# Altium footprint library SG__PCB_HOLE_Connector.PcbLib: 154 footprints (part 1 of 10)
Each footprint in its own frame and in the unit in brackets; x right, y up, seen from the top. Pads: shape width x height; smd on the part's side, far side on the other; paste and mask are expansions set on the pad; w line width, h text height; cw(c..) or ccw(c..) is an arc to the next point about the centre after c.
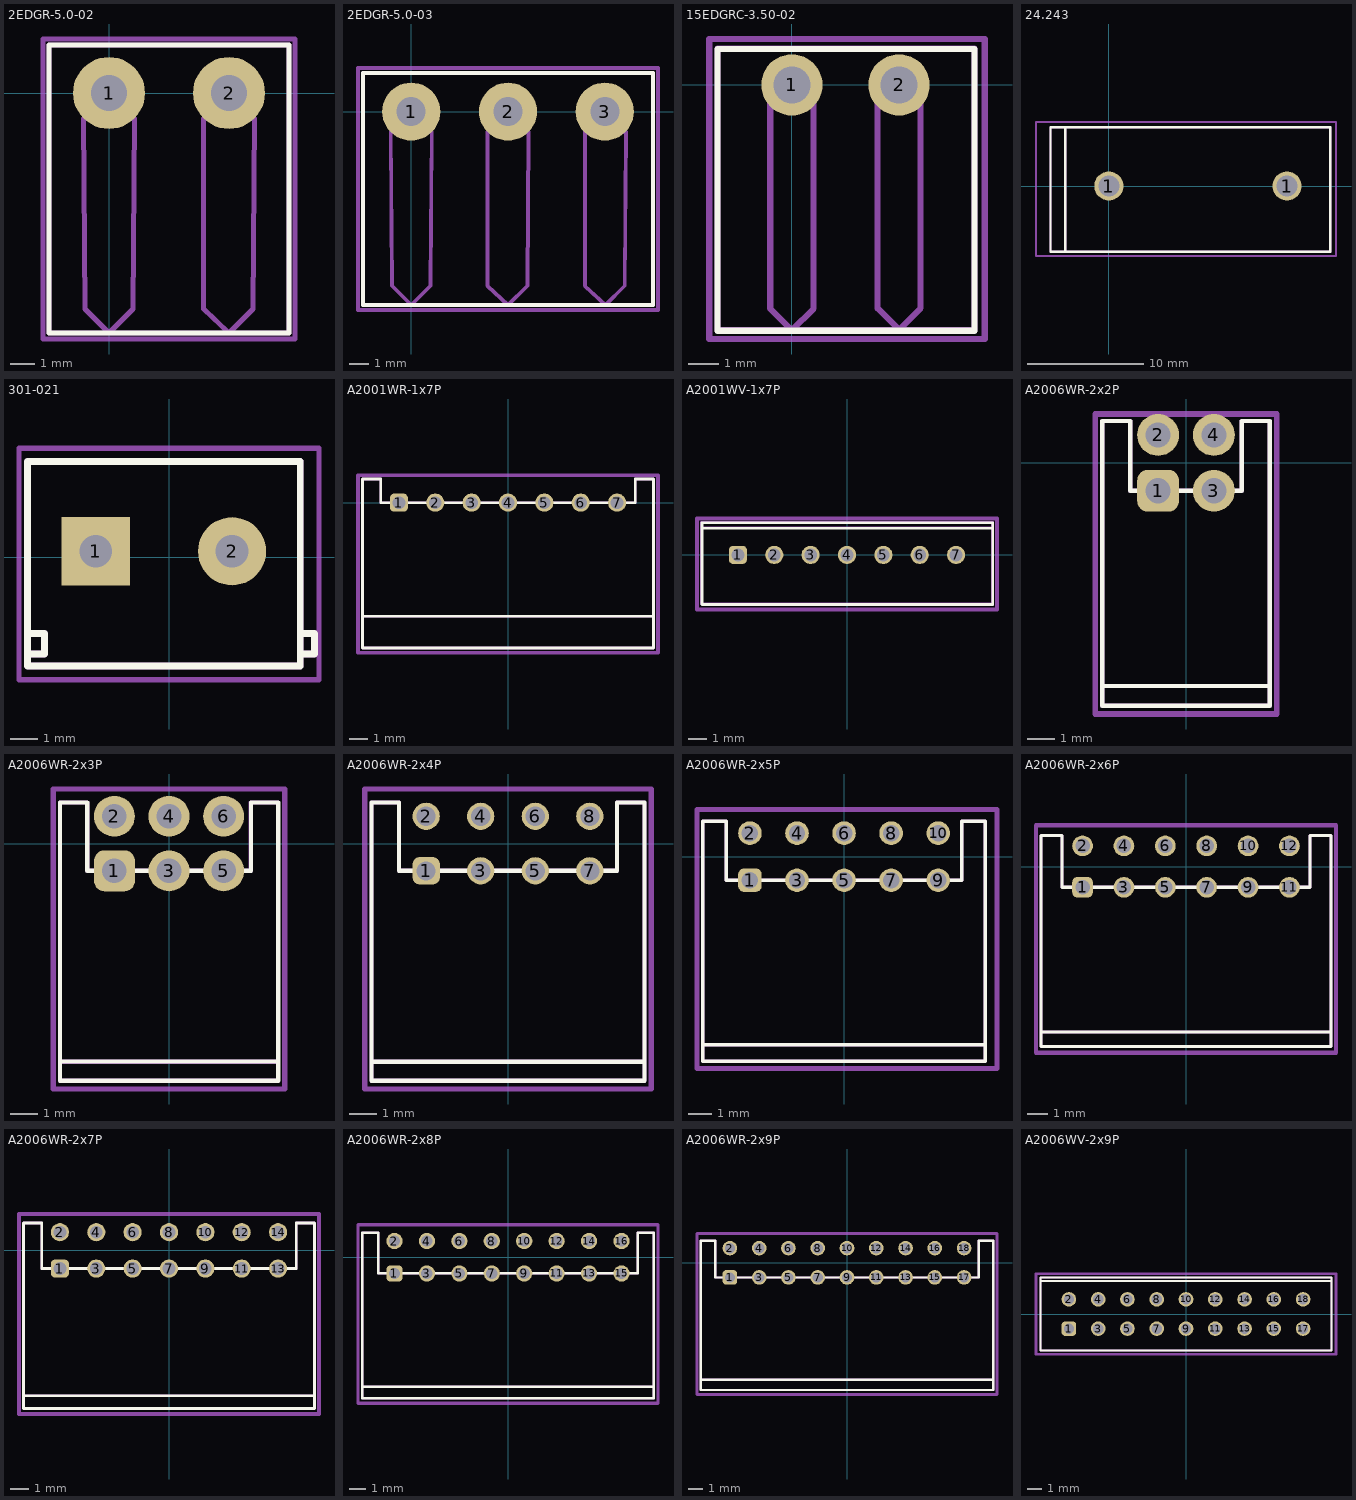
[diagram p0: the footprints below, top view; thin cyan lines are the x and y axes]

## 2EDGR-5.0-02 [mm]
pads (2):
  round 3 hole 1.5: 1(0,0) 2(5,0)
Top Overlay:
  lines w0.2: -2.5,-10 7.5,-10 7.5,2 -2.5,2 -2.5,-10
Top Assembly:
  lines w0.2: 1,-1.061 -1.061,-1.061 -1,-9 0,-10 1,-9 1.061,-1.061 ; 5.801,-1.061 6,-1.061 3.939,-1.061 3.939,-9 5,-10 6,-9 6.061,-1.061 ; -2.5,-10 -2.5,2 7.5,2 7.5,-10 -2.5,-10
Top Courtyard:
  lines w0.2: -2.75,-10.25 7.75,-10.25 7.75,2.25 -2.75,2.25 -2.75,-10.25
3D body "2EDGR-5.0-02P-1Y-100AH.stp": height 8.9, standoff -2.8, extent -2.5,-10 7.5,2

## 2EDGR-5.0-03 [mm]
pads (3):
  round 3 hole 1.5: 1(0,0) 2(5,0) 3(10,0)
Top Overlay:
  lines w0.2: -2.5,-10 -2.5,2 12.5,2 12.5,-10 -2.5,-10
Top Assembly:
  lines w0.2: 1,-1.061 -1.061,-1.061 -1,-9 0,-10 1,-9 1.061,-1.061 ; 5.801,-1.061 6,-1.061 3.939,-1.061 3.939,-9 5,-10 6,-9 6.061,-1.061 ; 10.831,-1.061 11.03,-1.061 8.97,-1.061 8.97,-9 10.03,-10 11.03,-9 11.091,-1.061 ; -2.5,-10 12.5,-10 12.5,2 -2.5,2 -2.5,-10
Top Courtyard:
  lines w0.2: -2.75,-10.25 -2.75,2.25 12.75,2.25 12.75,-10.25 -2.75,-10.25
3D body "2EDGR-5.0-03P-1Y-100AH.stp": height 8.9, standoff -2.8, extent -2.5,-10 12.5,2

## 15EDGRC-3.50-02 [mm]
pads (2):
  round 2 hole 1.2: 1(0,0) 2(3.5,0)
Top Overlay:
  lines w0.2: -2.429,-8.031 -2.429,1.169 5.971,1.169 5.971,-8.031 -2.429,-8.031
Top Assembly:
  lines w0.2: -2.436,-8.015 5.963,-8.015 5.963,1.185 -2.436,1.185 -2.436,-8.015 ; -0.707,-7.307 -0.707,-0.5 0.707,-0.5 0.707,-7.307 0,-8.015 -0.707,-7.307 ; 2.8,-7.3 2.8,-0.5 4.207,-0.5 4.207,-7.293 3.5,-8 2.8,-7.3
Top Courtyard:
  lines w0.2: -2.7,-8.3 6.3,-8.3 6.3,1.5 -2.7,1.5 -2.7,-8.3
3D body "15EDGRC-THR-3.5-02P-13-10A(H).stp": height 7, standoff -3.6, extent -2.436,-8.015 5.963,1.185

## 24.243 [mm] "Banan_Deltron_571-0100"
pads (2):
  round 2.5 hole 1.8: 1(0,0) 1(15.3,0)
Top Overlay:
  lines w0.2: -3.837,5.05 -3.752,5.05 -3.752,-5.65 ; -5,-5.65 -5,5.05 19,5.05 19,-5.65 -5,-5.65
Top Assembly:
  lines w0.2: -3.837,5.05 -3.752,5.05 -3.752,-5.65 ; -5,-5.65 19,-5.65 19,5.05 -5,5.05 -5,-5.65
Top Courtyard:
  lines w0.2: -6.25,-6 -6.25,5.5 19.5,5.5 19.5,-6 -6.25,-6
3D body "Banana_black.step": height 13.5, standoff -5.5, extent -5,-5.65 19,5.05

## 301-021 [mm] "301-021 Клеммник"
pads (2):
  rect 2.5x2.5 hole 1.2: 1(-2.688,0.216)
  round 2.5 hole 1.2: 2(2.312,0.216)
Top Overlay:
  lines w0.254: -5.08,-3.556 -4.572,-3.556 -4.572,-2.794 -5.08,-2.794 ; 4.826,-3.556 5.334,-3.556 5.334,-2.794 4.826,-2.794 ; -5.188,-3.984 -5.188,3.516 4.812,3.516 4.812,-3.984 -5.188,-3.984
Top Assembly:
  lines w0.254: -5.08,-3.556 -4.572,-3.556 -4.572,-2.794 -5.08,-2.794 ; 4.826,-3.556 5.334,-3.556 5.334,-2.794 4.826,-2.794 ; -5.188,-3.984 4.812,-3.984 4.812,3.516 -5.188,3.516 -5.188,-3.984
Top Courtyard:
  lines w0.2: -5.5,-4.5 5.5,-4.5 5.5,4 -5.5,4 -5.5,-4.5
3D body "301-021.stp": height 10, standoff -3.46, extent -5.088,-3.884 5.412,3.716

## A2001WR-1x7P [mm] "PLD-7-2.0"
pads (7):
  rrect50% 1x1 / inner rrect50% 1.5x1.5 / far side rrect50% 1.6x1.6 hole 0.7: 1(-6,0)
  round 1 / inner round 1.5 / far side round 1.6 hole 0.7: 2(-4,0) 3(-2,0) 4(0,0) 5(2,0) 6(4,0) 7(6,0)
Top Overlay:
  lines w0.152: -8,-6.25 8,-6.25 ; -8,-8 -5.1,-8 8,-8 8,1.3 7,1.3 7,0 -1,0 -7,0 -7,1.3 -8,1.3 -8,0 -8,-8
Top Assembly:
  lines w0.152: -8,-6.25 8,-6.25 ; -8,-8 -8,0 -8,1.3 -7,1.3 -7,0 -1,0 7,0 7,1.3 8,1.3 8,-8 -5.1,-8 -8,-8
Top Courtyard:
  lines w0.2: -8.25,-8.25 8.25,-8.25 8.25,1.5 -8.25,1.5 -8.25,-8.25
3D body: height 4.85, standoff 0, extent -8,-8 8,1.3

## A2001WV-1x7P [mm] "PLD-7-2.0"
pads (7):
  rrect50% 1x1 / inner rrect50% 1.5x1.5 / far side rrect50% 1.6x1.6 hole 0.7: 1(-6,0)
  round 1 / inner round 1.5 / far side round 1.6 hole 0.7: 2(-4,0) 3(-2,0) 4(0,0) 5(2,0) 6(4,0) 7(6,0)
Top Overlay:
  lines w0.152: -7.982,1.468 8.018,1.468 ; -7.982,-2.732 -7.982,1.768 8.018,1.768 8.018,-2.732 -7.982,-2.732
Top Assembly:
  lines w0.152: -8,1.5 8,1.5 ; -8,-2.7 8,-2.7 8,1.8 -8,1.8 -8,-2.7
Top Courtyard:
  lines w0.2: -8.25,-3 -8.25,2 8.25,2 8.25,-3 -8.25,-3
3D body: height 6.1, standoff 0, extent -8,-2.7 8,1.8

## A2006WR-2x2P [mm] "PLD-10-2.0"
pads (4):
  rrect50% 1.5x1.5 hole 0.9: 1(-1,-1)
  round 1.5 hole 0.9: 2(-1,1) 3(1,-1) 4(1,1)
Top Overlay:
  lines w0.152: -3,-8 3,-8 ; -3,-8.7 3,-8.7 3,-3 3,1.5 2,1.5 2,-1 -2,-1 -2,1.5 -3,1.5 -3,-1 -3,-8.7
Top Assembly:
  lines w0.152: -3,-8 3,-8 ; -3,-8.7 3,-8.7 3,-3 3,1.5 2,1.5 2,-1 -2,-1 -2,1.5 -3,1.5 -3,-1 -3,-8.7
Top Courtyard:
  lines w0.2: -3.25,-9 -3.25,1.75 3.25,1.75 3.25,-9 -3.25,-9
3D body: height 5, standoff 0, extent -3,-8.7 3,1.5

## A2006WR-2x3P [mm] "PLD-10-2.0"
pads (6):
  rrect50% 1.5x1.5 hole 0.9: 1(-2,-1)
  round 1.5 hole 0.9: 2(-2,1) 3(0,-1) 4(0,1) 5(2,-1) 6(2,1)
Top Overlay:
  lines w0.152: -3.996,-7.996 4.004,-7.996 ; -3.996,-8.696 4.004,-8.696 4.004,-0.996 4.004,1.504 3.004,1.504 3.004,-0.996 -2.996,-0.996 -2.996,1.504 -3.996,1.504 -3.996,-0.996 -3.996,-8.696
Top Assembly:
  lines w0.152: -4,-8 4,-8 ; -4,-8.7 -4,-1 -4,1.5 -3,1.5 -3,-1 3,-1 3,1.5 4,1.5 4,-1 4,-8.7 -4,-8.7
Top Courtyard:
  lines w0.2: -4.25,-9 -4.25,2 4.25,2 4.25,-9 -4.25,-9
3D body: height 5, standoff 0, extent -4,-8.7 4,1.5

## A2006WR-2x4P [mm] "PLD-10-2.0"
pads (8):
  rrect50% 1x1 / inner rrect50% 1.5x1.5 / far side rrect50% 1.6x1.6 hole 0.7: 1(-3,-1)
  round 1 / inner round 1.5 / far side round 1.6 hole 0.7: 2(-3,1) 3(-1,-1) 4(-1,1) 5(1,-1) 6(1,1) 7(3,-1) 8(3,1)
Top Overlay:
  lines w0.152: -5,-8 5,-8 ; -5,-8.7 5,-8.7 5,-3 5,1.5 4,1.5 4,-1 2,-1 -4,-1 -4,1.5 -5,1.5 -5,-1 -5,-8.7
Top Assembly:
  lines w0.152: -5,-8 5,-8 ; -5,-8.7 -5,-1 -5,1.5 -4,1.5 -4,-1 2,-1 4,-1 4,1.5 5,1.5 5,-3 5,-8.7 -5,-8.7
Top Courtyard:
  lines w0.2: -5.25,-9 -5.25,2 5.25,2 5.25,-9 -5.25,-9
3D body: height 5, standoff 0, extent -5,-8.7 5,1.5

## A2006WR-2x5P [mm] "PLD-10-2.0"
pads (10):
  rrect50% 1x1 / inner rrect50% 1.5x1.5 / far side rrect50% 1.6x1.6 hole 0.7: 1(-4,-1)
  round 1 / inner round 1.5 / far side round 1.6 hole 0.7: 2(-4,1) 3(-2,-1) 4(-2,1) 5(0,-1) 6(0,1) 7(2,-1) 8(2,1) 9(4,-1) 10(4,1)
Top Overlay:
  lines w0.152: -6,-8 -6,-8.7 4.5,-8.7 6,-8.7 6,-8 ; -6,-8 -6,-1 -6,1.5 -5,1.5 -5,-1 0.8,-1 5,-1 5,1.5 6,1.5 6,-3 6,-8 ; -6,-8 -4,-8 6,-8
Top Assembly:
  lines w0.152: -6,-8 -6,-1 -6,1.5 -5,1.5 -5,-1 0.8,-1 5,-1 5,1.5 6,1.5 6,-3 6,-8 ; -6,-8 -4,-8 6,-8 ; -6,-8 -6,-8.7 4.5,-8.7 6,-8.7 6,-8
Top Courtyard:
  lines w0.2: -6.25,-9 -6.25,2 6.5,2 6.5,-9 -6.25,-9
3D body "A2211WR-2X05P.STEP": height 5, standoff -2, extent -6,-8 6,1.5

## A2006WR-2x6P [mm] "PLD-10-2.0"
pads (12):
  rrect50% 1x1 / inner rrect50% 1.5x1.5 / far side rrect50% 1.6x1.6 hole 0.7: 1(-5,-1)
  round 1 / inner round 1.5 / far side round 1.6 hole 0.7: 2(-5,1) 3(-3,-1) 4(-3,1) 5(-1,-1) 6(-1,1) 7(1,-1) 8(1,1) 9(3,-1) 10(3,1) 11(5,-1) 12(5,1)
Top Overlay:
  lines w0.152: -7,-8 7,-8 ; -6.6,-8.7 -6.4,-8.7 ; -7,-8.7 -5,-8.7 7,-8.7 7,-0.2 7,1.5 6,1.5 6,-1 0,-1 -6,-1 -6,1.5 -7,1.5 -7,-1 -7,-8.7
Top Assembly:
  lines w0.152: -7,-8 7,-8 ; -6.6,-8.7 -6.4,-8.7 ; -7,-8.7 -7,-1 -7,1.5 -6,1.5 -6,-1 0,-1 6,-1 6,1.5 7,1.5 7,-0.2 7,-8.7 -5,-8.7 -7,-8.7
Top Courtyard:
  lines w0.2: -7.25,-9 -7.25,2 7.25,2 7.25,-9 -7.25,-9
3D body: height 5, standoff 0, extent -7,-8.7 7,1.5

## A2006WR-2x7P [mm] "PLD-10-2.0"
pads (14):
  rrect50% 1x1 / inner rrect50% 1.5x1.5 / far side rrect50% 1.6x1.6 hole 0.7: 1(-6,-1)
  round 1 / inner round 1.5 / far side round 1.6 hole 0.7: 2(-6,1) 3(-4,-1) 4(-4,1) 5(-2,-1) 6(-2,1) 7(0,-1) 8(0,1) 9(2,-1) 10(2,1) 11(4,-1) 12(4,1) 13(6,-1) 14(6,1)
Top Overlay:
  lines w0.152: -8,-8 8,-8 ; -7.6,-8.7 -7.4,-8.7 ; -8,-8.7 -8,-1 -8,1.5 -7,1.5 -7,-1 -1,-1 7,-1 7,1.5 8,1.5 8,-8.7 -6,-8.7 -8,-8.7
Top Assembly:
  lines w0.152: -8,-8 8,-8 ; -7.6,-8.7 -7.4,-8.7 ; -8,-8.7 -6,-8.7 8,-8.7 8,1.5 7,1.5 7,-1 -1,-1 -7,-1 -7,1.5 -8,1.5 -8,-1 -8,-8.7
Top Courtyard:
  lines w0.2: -8.25,-9 -8.25,2 8.25,2 8.25,-9 -8.25,-9
3D body: height 5, standoff 0, extent -8,-8.7 8,1.5

## A2006WR-2x8P [mm] "PLD-10-2.0"
pads (16):
  rrect50% 1x1 / inner rrect50% 1.5x1.5 / far side rrect50% 1.6x1.6 hole 0.7: 1(-7,-1)
  round 1 / inner round 1.5 / far side round 1.6 hole 0.7: 2(-7,1) 3(-5,-1) 4(-5,1) 5(-3,-1) 6(-3,1) 7(-1,-1) 8(-1,1) 9(1,-1) 10(1,1) 11(3,-1) 12(3,1) 13(5,-1) 14(5,1) 15(7,-1) 16(7,1)
Top Overlay:
  lines w0.152: -9,-8 9,-8 ; -8.6,-8.7 -8.4,-8.7 ; -9,-8.7 -7,-8.7 9,-8.7 9,-0.2 9,1.5 8,1.5 8,-1 -2,-1 -8,-1 -8,1.5 -9,1.5 -9,-1 -9,-8.7
Top Assembly:
  lines w0.152: -9,-8 9,-8 ; -8.6,-8.7 -8.4,-8.7 ; -9,-8.7 -9,-1 -9,1.5 -8,1.5 -8,-1 -2,-1 8,-1 8,1.5 9,1.5 9,-0.2 9,-8.7 -7,-8.7 -9,-8.7
Top Courtyard:
  lines w0.2: -9.25,-9 9.25,-9 9.25,2 -9.25,2 -9.25,-9
3D body: height 5, standoff 0, extent -9,-8.7 9,1.5

## A2006WR-2x9P [mm] "PLD-18-2.0"
pads (18):
  rrect50% 1x1 / inner rrect50% 1.5x1.5 / far side rrect50% 1.6x1.6 hole 0.7: 1(-8,-1)
  round 1 / inner round 1.5 / far side round 1.6 hole 0.7: 2(-8,1) 3(-6,-1) 4(-6,1) 5(-4,-1) 6(-4,1) 7(-2,-1) 8(-2,1) 9(0,-1) 10(0,1) 11(2,-1) 12(2,1) 13(4,-1) 14(4,1) 15(6,-1) 16(6,1) 17(8,-1) 18(8,1)
Top Overlay:
  lines w0.152: -10,-8 10,-8 ; -9.6,-8.7 -9.4,-8.7 ; -10,-8.7 -10,-1 -10,1.5 -9,1.5 -9,-1 -3,-1 9,-1 9,1.5 10,1.5 10,-2.2 10,-8.7 -8,-8.7 -10,-8.7
Top Assembly:
  lines w0.152: -10,-8 10,-8 ; -9.6,-8.7 -9.4,-8.7 ; -10,-8.7 -8,-8.7 10,-8.7 10,-2.2 10,1.5 9,1.5 9,-1 -3,-1 -9,-1 -9,1.5 -10,1.5 -10,-1 -10,-8.7
Top Courtyard:
  lines w0.2: -10.25,-9 10.25,-9 10.25,2 -10.25,2 -10.25,-9
3D body: height 5, standoff 0, extent -10,-8.7 10,1.5

## A2006WV-2x9P [mm] "PLD-18-2.0"
pads (18):
  rrect50% 1x1 / inner rrect50% 1.5x1.5 / far side rrect50% 1.6x1.6 hole 0.7: 1(-8,-1)
  round 1 / inner round 1.5 / far side round 1.6 hole 0.7: 2(-8,1) 3(-6,-1) 4(-6,1) 5(-4,-1) 6(-4,1) 7(-2,-1) 8(-2,1) 9(0,-1) 10(0,1) 11(2,-1) 12(2,1) 13(4,-1) 14(4,1) 15(6,-1) 16(6,1) 17(8,-1) 18(8,1)
Top Overlay:
  lines w0.152: -9.95,2.25 9.95,2.25 ; -9.95,-2.5 -9.95,2.5 9.95,2.5 9.95,-2.5 -9.95,-2.5
Top Assembly:
  lines w0.152: -9.95,2.25 9.95,2.25 ; -9.95,-2.5 -9.95,2.5 9.95,2.5 9.95,-2.5 -9.95,-2.5
Top Courtyard:
  lines w0.2: -10.25,-2.75 -10.25,2.75 10.25,2.75 10.25,-2.75 -10.25,-2.75
3D body: height 6.5, standoff 0, extent -9.95,-2.5 9.95,2.5